# Altium footprint library Udemy_Library.PcbLib: 35 footprints (part 2 of 3)
Each footprint in its own frame and in the unit in brackets; x right, y up, seen from the top. Pads: shape width x height; smd on the part's side, far side on the other; paste and mask are expansions set on the pad; w line width, h text height; cw(c..) or ccw(c..) is an arc to the next point about the centre after c.
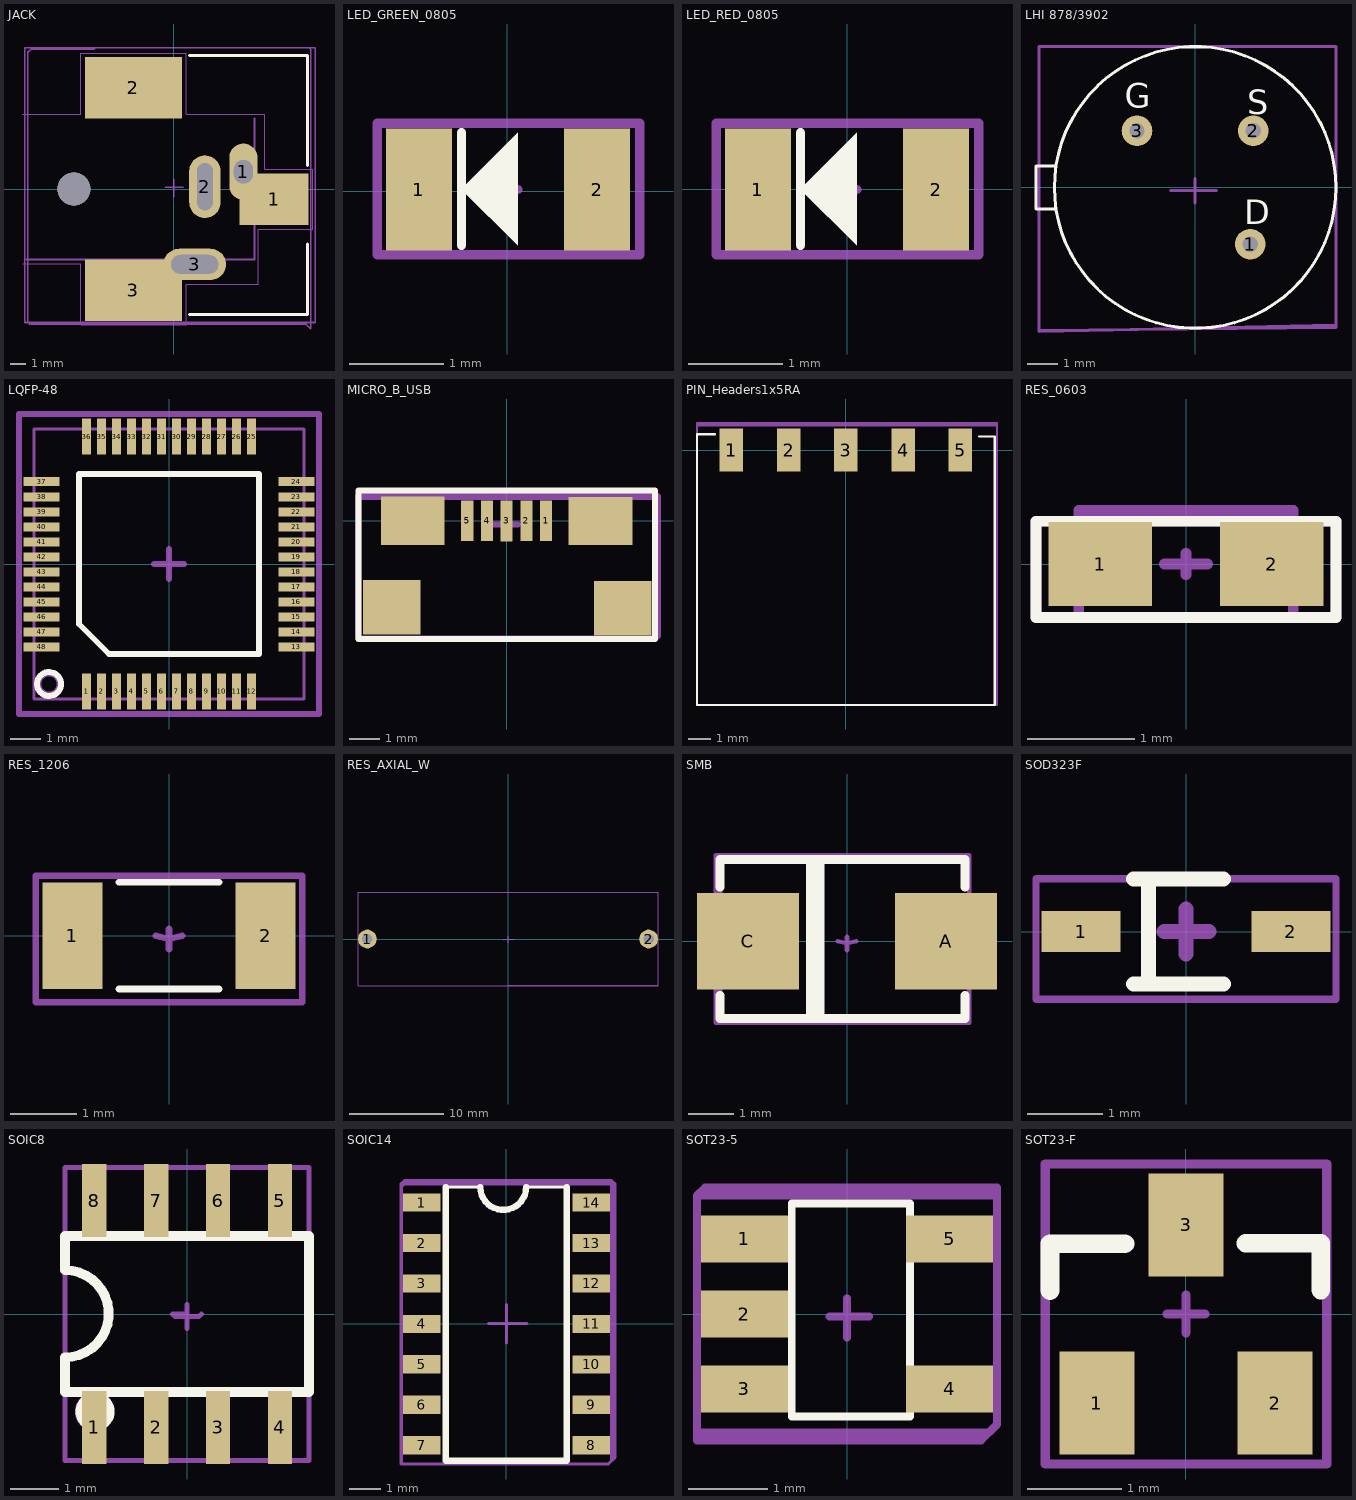
[diagram p1: the footprints below, top view; thin cyan lines are the x and y axes]

## JACK [mm] "Power Barrel Connector Jack 2.10mm ID (0.083\"), 5.50mm OD (0.217\") Surface Mount, Right Angle; Through Hole"
pads (7):
  oval 1.8x3.6 hole 1.2 slot 1.5 at 90 deg: 1(4.425,1.1)
  rect 4.4x3.3 smd: 1(6.375,-0.65)
  rect 6.2x3.9 smd: 2(-2.575,6.45) 3(-2.575,-6.45)
  oval 2x4 hole 1 slot 3 at 90 deg: 2(1.975,0.15)
  oval 4x2 hole 1.2 slot 3 at 0 deg: 3(1.325,-4.8)
  round 2.1 hole 2.1 unplated: ""(-6.375,0)
Top Overlay:
  lines w0.2: 1,-8 8.5,-8 8.5,-3.5 ; 1,8.5 8.5,8.5 8.5,1.5
Top Component Center:
  lines w0.1: -0.538,0.112 0.58,0.112 ; -0.003,-0.503 -0.003,0.614 ; -9.3,-8.5 -9.2,-8.6 8.4,-8.6 8.7,-8.9 8.7,8.9 8.6,9 5.2,9 -1.6,9 -5,9 -5.1,8.9 -9.1,8.9 -9.3,8.7 -9.3,-8.5
Top Designator:
  lines w0.1: -9.5,-8.5 9,-8.5 9,9 -9.5,9 -9.5,-8.5
  text ".Designator" at -1.9,0.367 h0.8
Mechanical 13:
  lines w0.127: -9.375,-4.5 5.125,-4.5 5.125,4.5
Mechanical 15:
  lines w0.05: -9.625,-4.75 -5.925,-4.75 -5.925,-8.65 0.775,-8.65 0.775,-6.05 5.375,-6.05 5.375,-2.55 8.825,-2.55 8.825,1.25 5.775,1.25 5.775,4.75 0.775,4.75 0.775,8.65 -5.925,8.65 -5.925,4.75 -9.625,4.75
3D body "jack.step": height 11.1, standoff -3.3, extent -9.275,-7.45 7.825,7.75

## LED_GREEN_0805 [mm]
pads (2):
  rect 0.7x1.3 smd mask+0.05: 1(-0.943,0.018) 2(0.957,0.018)
Top Overlay:
  region: 0.111,0.624 0.111,-0.576 -0.489,0.024
  lines w0.1: -0.489,-0.576 -0.489,0.624
Top Component Center:
  lines w0.1: -0.087,0.018 0.113,0.018 ; 0.011,-0.076 0.011,0.124 ; -1.389,-0.676 -1.389,0.724 1.411,0.724 1.411,-0.676 -1.389,-0.676
Top Designator:
  lines w0.1: -1.389,-0.676 1.411,-0.676 1.411,0.724 -1.389,0.724 -1.389,-0.676
  text ".Designator" at -1.389,-0.11 h0.5
3D body "LED-0805-green.step": height 0.8, standoff -0.01, extent -1,-0.625 1,0.625

## LED_RED_0805 [mm]
pads (2):
  rect 0.7x1.3 smd mask+0.05: 1(-0.953,-0.006) 2(0.947,-0.006)
Top Overlay:
  region: 0.1,0.6 0.1,-0.6 -0.5,0
  lines w0.1: -0.5,-0.6 -0.5,0.6
Top Component Center:
  lines w0.1: -0.098,-0.006 0.102,-0.006 ; 0,-0.1 0,0.1 ; -1.4,-0.7 -1.4,0.7 1.4,0.7 1.4,-0.7 -1.4,-0.7
Top Designator:
  lines w0.1: -1.4,-0.7 1.4,-0.7 1.4,0.7 -1.4,0.7 -1.4,-0.7
  text ".Designator" at -1.4,-0.133 h0.5
3D body "LED-0805-red.step": height 0.8, standoff -0.01, extent -1,-0.625 1,0.625

## LHI 878/3902 [mm]
pads (3):
  round 1 hole 0.5 mask+0.05: 1(1.8,-1.85) 2(1.9,1.85) 3(-1.9,1.85)
Top Overlay:
  circle w0.1: c0,0 r4.6
  lines w0.1: -4.6,-0.7 -5.2,-0.7 -5.2,0.7 -4.6,0.7
  text "D" at 1.6,-1.2 h0.8
  text "S" at 1.7,2.4 h0.8
  text "G" at -2.3,2.6 h0.8
Top Component Center:
  lines w0.1: 0,0.3 0,-0.5 0,-0.1 ; 0.7,-0.1 0,-0.1 ; 0,-0.1 -0.8,-0.1 0,-0.1 ; -5.1,-4.7 4.6,-4.5 4.6,4.6 -5.1,4.6 -5.1,-4.7
Top Designator:
  lines w0.1: -5.1,-4.671 4.6,-4.571 4.6,4.6 -5.1,4.6 -5.1,-4.671
  text ".Designator" at -1.4,-0.333 h0.8
3D body "User Library-LHI878-1.SLDPRT": height 4.6, standoff -4.8, extent -5.081,-4.542 4.588,4.642

## LQFP-48 [mm] "7mmx7mm"
pads (50):
  rect 0.3x1.2 smd mask+0.05: 1(-2.75,-4.25) 2(-2.25,-4.25) 3(-1.75,-4.25) 4(-1.25,-4.25) 5(-0.75,-4.25) 6(-0.25,-4.25) 7(0.25,-4.25) 8(0.75,-4.25) 9(1.25,-4.25) 10(1.75,-4.25) 11(2.25,-4.25) 12(2.75,-4.25) 25(2.75,4.25) 26(2.25,4.25) 27(1.75,4.25) 28(1.25,4.25) 29(0.75,4.25) 30(0.25,4.25) 31(-0.25,4.25) 32(-0.75,4.25) 33(-1.25,4.25) 34(-1.75,4.25) 35(-2.25,4.25) 36(-2.75,4.25) ""(1.75,4.25)
  rect 1.2x0.3 smd mask+0.05: 13(4.25,-2.76) 14(4.25,-2.26) 15(4.25,-1.76) 16(4.25,-1.26) 17(4.25,-0.76) 18(4.25,-0.26) 19(4.25,0.24) 20(4.25,0.74) 21(4.25,1.24) 22(4.25,1.74) 23(4.25,2.24) 24(4.25,2.75) 37(-4.25,2.75) 38(-4.25,2.24) 39(-4.25,1.74) 40(-4.25,1.24) 41(-4.25,0.74) 42(-4.25,0.24) 43(-4.25,-0.26) 44(-4.25,-0.76) 45(-4.25,-1.26) 46(-4.25,-1.76) 47(-4.25,-2.26) 48(-4.25,-2.76) ""(-4.25,1.74)
Top Overlay:
  circle w0.2: c-4,-4 r0.4
  lines w0.2: -3,-2 -3,3 3,3 3,-3 -2,-3 -3,-2
Top 3D Body:
  circle w0.2: c-4,-4 r0.354
  lines w0.1: -4.5,-4.5 -4.5,4.5 4.5,4.5 4.5,-4.5 -4.5,-4.5
Top Component Center:
  lines w0.2: 0,-0.5 0,-0.25 ; 0.5,0 -0.5,0 0,0 0,-0.25 ; 0,-0.25 0,0.25 0,0.5 0,-0.25 ; -5,-5 5,-5 5,5 -5,5 -5,-5
Top Designator:
  lines w0.2: -5,-5 -5,5 5,5 5,-5 -5,-5
  text ".Designator" at -2.4,-0.233 h0.5
3D body "User Library-STM32F103C8T6.step": height 1.5, standoff -0.05, extent -4.5,-4.5 4.5,4.5

## MICRO_B_USB [mm]
pads (9):
  rect 0.4x1.35 smd mask+0.05: 1(1.302,0.007) 2(0.653,0.007) 3(0,0) 4(-0.645,0.007) 5(-1.303,0.007)
  rect 1.9x1.8 smd mask+0.05: ""(-3.8,-2.85) ""(3.828,-2.877)
  rect 2.1x1.6 smd mask+0.05: ""(-3.1,0.007) ""(3.1,0)
Top Overlay:
  lines w0.2: -4.9,-3.9 -4.9,1 4.9,1 4.9,-3.9 -4.9,-3.9
Top Component Center:
  lines w0.2: -0.43,-0.116 0.37,-0.116 ; 0,-0.5 0,0.3 ; -4.91,-3.882 4.89,-3.882 4.99,-3.782 4.99,0.818 2.865,0.818 -0.585,0.818 -1.467,0.818 -2.029,0.818 -2.51,0.818 -3.46,0.818 -4.16,0.818 -4.91,0.818 -4.91,-3.882 ; -4.9,-3.9 4.9,-3.9 5,-3.8 5,0.8 2.875,0.8 -0.575,0.8 -1.456,0.8 -2.019,0.8 -2.5,0.8 -3.45,0.8 -4.15,0.8 -4.9,0.8 -4.9,-3.9
Top Designator:
  lines w0.2: -4.9,-3.9 -4.9,0.8 -4.8,0.9 4.9,0.9 5,0.8 5,-3.8 4.9,-3.9 -4.9,-3.9
  text ".Designator" at -3,-1.033 h0.8
3D body "10118192C.stp": height 2.79, standoff -0.22, extent -3.956,-5.361 3.956,0.3

## PIN_Headers1x5RA [mm]
pads (6):
  rect 1.04x1.91 smd mask+0.05: 1(-5.08,0.004) 1(-5.08,0.004) 2(-2.541,0) 3(-0.008,0) 4(2.538,-0.004) 5(5.08,0.004)
Top Overlay:
  lines w0.1: -5.8,0.7 -6.6,0.7 -6.6,-11.3 6.6,-11.3 6.6,0.6 5.9,0.6
Top Component Center:
  lines w0.1: -0.465,0.026 0.435,0.026 ; 0,-0.4 0,0.5 ; 6.7,0.6 6.7,1.2 ; 6.7,0.6 6.7,-11.3 -6.6,-11.3 -6.6,1.2 -5.8,1.2 6.7,1.2 ; 6.7,0.6 6.7,1.2
Top Designator:
  lines w0.1: -6.6,-11.3 -6.6,1.1 -5.7,1.1 6.4,1.1 6.7,1.1 6.7,-11.3 -6.6,-11.3
  text ".Designator" at -2.2,-0.433 h0.8
3D body "SMH-105-02-L-S.stp": height 2.41, standoff -0.01, extent -6.604,-11.309 6.604,0.629

## RES_0603 [mil]
pads (2):
  rect 38x31 smd mask+1.97: 1(-31.5,0) 2(31.5,0)
Top Overlay:
  lines w3.94: -55.12,-19.68 -55.12,15.75 55.12,15.75 55.12,-19.68 -55.12,-19.68
Top 3D Body:
  lines w3.94: -39.37,-19.68 39.37,-19.68 39.37,19.68 -39.37,19.68 -39.37,-19.68
Top Component Center:
  lines w3.94: 0,3.94 0,-3.94 0,0 ; 7.87,0 0,0 ; 0,0 -7.87,0 0,0 ; -55.12,-19.68 -55.12,15.75 55.12,15.75 55.12,-19.68 -55.12,-19.68
Top Designator:
  lines w3.94: -55.12,-19.68 -55.12,15.75 55.12,15.75 55.12,-19.68 -55.12,-19.68
  text ".Designator" at -7.87,-15.75 h11.81
3D body "0603S1.STEP": height 16.89, standoff -0.83, extent -38.92,-19.68 38.92,18.88

## RES_1206 [mm]
pads (2):
  rect 0.9x1.6 smd mask+0.05: 1(-1.45,0) 2(1.45,0)
Top Overlay:
  lines w0.1: -0.75,-0.8 0.75,-0.8 ; -0.75,0.8 0.75,0.8
Top Component Center:
  lines w0.1: 0,0.1 0,-0.2 0,-0.05 ; 0.2,0 0,-0.05 ; 0,-0.05 -0.2,0 0,-0.05 ; -2,-1 -2,0.9 2,0.9 2,-1 -2,-1
Top Designator:
  lines w0.1: -2,-1 2,-1 2,0.9 -2,0.9 -2,-1
  text ".Designator" at -1.6,-0.433 h0.8
3D body "res1206r.STEP": height 0.55, standoff 0, extent -1.984,-1.038 1.984,0.838

## RES_AXIAL_W [mm]
pads (2):
  round 2 hole 1.1 mask+0.05: 1(-15,0) 2(15,0)
Top Component Center:
  lines w0.1: 0,0.3 0,-0.4 0,-0.05 ; 0.7,0 0,-0.05 ; 0,-0.05 -0.5,-0.1 0,-0.05 ; -16,-5 16,-5 16,5 -16,5 -16,-5
Top Designator:
  lines w0.1: -16,-5 16,-4.9 16,5 -16,5 -16,-5
  text ".Designator" at -2.6,0.167 h0.8
3D body: height 5, standoff -4, extent 14.6,-0.4 15.4,0.4
3D body: height 5.2, standoff 4.4, extent 6.4,-0.4 15.4,0.4
3D body: height 9.65, standoff 0, extent -11,-4.825 11,4.82
3D body: height 5, standoff -4, extent -15.4,-0.4 -14.6,0.4
3D body: height 5, standoff -5, extent 14.6,-0.4 15.4,0.4
3D body: height 5.2, standoff 4.4, extent -15.4,-0.4 -6.4,0.4

## SMB [mm]
pads (2):
  rect 2.25x2.12 smd: A(2.185,0) C(-2.185,0)
Top Overlay:
  rectangle: -0.901,-1.7 -0.501,1.7
  lines w0.2: -2.801,-1.2 -2.801,-1.7 2.599,-1.7 2.599,-1.2 ; -2.801,1.2 -2.801,1.8 2.599,1.8 2.599,1.2
Top Component Center:
  lines w0.1: -2.901,1.2 -2.901,1.9 2.699,1.9 2.699,1.2 2.699,-1.8 -2.901,-1.8 -2.901,1.55 ; 0,0.1 0,-0.2 0,-0.05 ; 0.2,0 0,-0.05 ; 0,-0.05 -0.2,0 0,-0.05
Top Designator:
  lines w0.1: -2.8,-1.8 2.7,-1.8 2.7,1.9 -2.8,1.9 -2.8,-1.8
  text ".Designator" at -2.4,-0.233 h0.8
3D body "1SMB5919BT3G.STEP": height 2.49, standoff 0.02, extent -2.821,-1.68 2.619,1.88

## SOD323F [mm]
pads (2):
  rect 1.05x0.55 smd mask+0.05: 1(-1.4,0) 2(1.4,0)
Top Overlay:
  lines w0.2: -0.7,-0.7 -0.3,-0.7 ; -0.7,0.7 0.5,0.7 ; -0.5,0.7 -0.5,-0.7 0.5,-0.7
Top Component Center:
  lines w0.1: -2,-0.9 -2,0.7 2,0.7 2,-0.9 -2,-0.9
  lines w0.2: -0.296,0 0.304,0 ; 0,-0.3 0,0.3
Top Designator:
  lines w0.1: -2,-0.9 2,-0.9 2,0.7 -2,0.7 -2,-0.9
  text ".Designator" at -1.6,-0.333 h0.5
3D body "SOD-323F.STEP": height 0.79, standoff -0.08, extent -1.35,-0.7 1.35,0.65

## SOIC8 [mm]
pads (9):
  rect 0.5x1.5 smd mask+0.05: 1(-1.905,-2.325) 2(-0.635,-2.325) 3(0.635,-2.325) 4(1.905,-2.325) 5(1.905,2.325) 6(0.635,2.325) 7(-0.635,2.325) 8(-1.905,2.325) ""(1.905,-2.325)
Top Overlay:
  circle w0.2: c-1.885,-2 r0.3
  lines w0.2: -2.5,-1.6 2.5,-1.6 2.5,1.6 -2.5,1.6 -2.5,0.9 cw(c-2.5,0.006) -2.5,-0.889 -2.5,-1.6
Top 3D Body:
  circle w0.2: c-1.9,-2 r0.3
  lines w0.1: -2.5,-3 -2.5,3 2.5,3 2.5,-3 -2.5,-3
Top Component Center:
  lines w0.1: 0,-0.3 0,0.2 ; 0.3,0 0.25,-0.05 0,-0.05 ; 0,-0.05 -0.25,-0.05 -0.3,0 -0.05,0 0,-0.05 ; -2.5,-3 -2.5,3 2.5,3 2.5,-3 -2.5,-3
Top Designator:
  lines w0.1: -2.5,-3 2.5,-3 2.5,3 -2.5,3 -2.5,-3
  text ".Designator" at 0.133,-2.2 h0.5
3D body "SOIC-8.step": height 1.52, standoff 0, extent -2.5,-2.856 2.4,3.044

## SOIC14 [mm]
pads (14):
  rect 1.18x0.57 smd mask+0.05: 1(-2.66,3.81) 2(-2.66,2.54) 3(-2.66,1.27) 4(-2.66,0) 5(-2.66,-1.27) 6(-2.66,-2.54) 7(-2.66,-3.81) 8(2.66,-3.81) 9(2.66,-2.54) 10(2.66,-1.27) 11(2.66,0) 12(2.66,1.27) 13(2.66,2.54) 14(2.66,3.81)
Top Overlay:
  lines w0.1: -1.9,4.3 -0.821,4.3 ; 0.621,4.3 1.9,4.3
  lines w0.2: -1.9,4.3 -1.9,-4.3 1.9,-4.3 1.9,4.3 ; -0.821,4.3 ccw(c-0.1,4.3) 0.621,4.3
Top Component Center:
  lines w0.1: -0.559,0.013 0.641,0.013 ; 0,-0.6 0,0.6 ; -3.3,-4.4 3.2,-4.4 3.3,-4.3 3.3,4.4 -3.2,4.4 -3.3,4.3 -3.3,-4.4
Top Designator:
  lines w0.1: -3.3,-4.4 -3.3,4.4 -3.2,4.5 3.3,4.5 3.4,4.4 3.4,-4.2 3.2,-4.4 -3.3,-4.4
  text ".Designator" at -2.9,-0.533 h0.8
3D body "User Library-SOIC-14, 3_9x8_65mm.step": height 2.05, standoff 0, extent -3,-4.325 3,4.325

## SOT23-5 [mm]
pads (5):
  rect 1.1x0.6 smd mask+0.05: 1(-1.3,0.95) 2(-1.3,0) 3(-1.3,-0.95) 4(1.3,-0.95) 5(1.3,0.95)
Top Overlay:
  lines w0.1: -0.7,-1.3 0.8,-1.3 0.8,1.4 -0.7,1.4 -0.7,-1.3
Top Component Center:
  lines w0.1: -0.223,-0.033 0.277,-0.033 ; 0,-0.3 0,0.2 ; -1.9,-1.5 1.8,-1.5 1.9,-1.4 1.9,1.5 -1.9,1.5 -1.9,-1.5
Top Designator:
  lines w0.1: -1.9,-1.6 -1.9,1.5 -1.8,1.6 1.9,1.6 1.9,-1.4 1.7,-1.6 -1.9,-1.6
  text ".Designator" at -1.9,-0.233 h0.8
3D body "OPA314AIDBVR.STEP": height 1.45, standoff 0, extent -1.4,-1.45 1.4,1.45

## SOT23-F [mm]
pads (3):
  rect 0.8x1.1 smd mask+0.05: 1(-0.95,-0.95) 2(0.95,-0.95) 3(0,0.95)
Top Overlay:
  lines w0.2: -1.45,0.25 -1.45,0.75 -0.65,0.75 ; 0.638,0.755 1.438,0.755 1.438,0.255
Top Component Center:
  lines w0.1: 0,0.2 0,-0.2 0,0 ; 0.2,0 0,0 ; 0,0 -0.2,0 0,0 ; -1.5,-1.6 1.5,-1.6 1.5,1.6 -0.4,1.6 -1.5,1.6 -1.5,-1.6
Top Designator:
  lines w0.1: -1.5,-1.6 1.5,-1.6 1.5,1.6 -0.1,1.6 -1.5,1.6 -1.5,-1.6
  text ".Designator" at -1,-0.333 h0.5
3D body "SOT23-F.STEP": height 0.9, standoff 0, extent -1.5,-1.25 1.4,1.15